# Altium schematic symbol library 13-Logic 数字 IC.SchLib: 324 symbols (part 10 of 30) (continued)
## MAX3485 (continued)
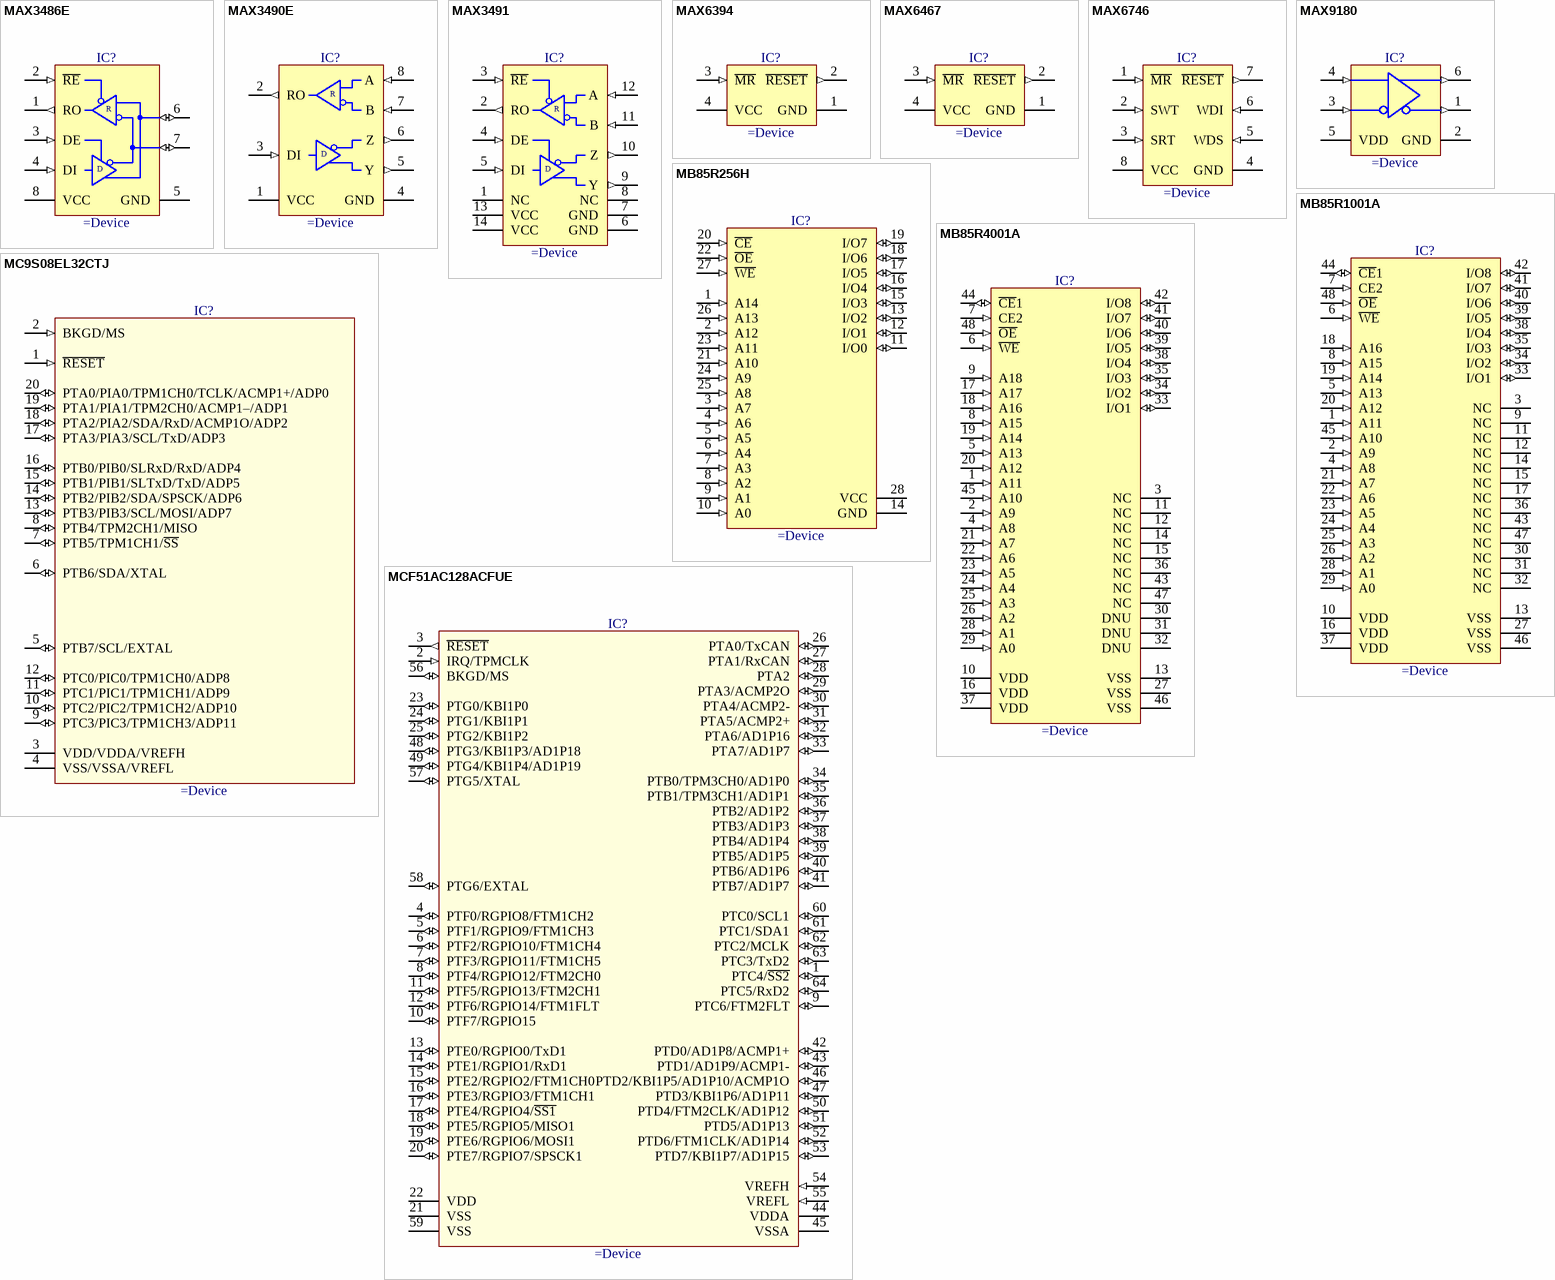
[diagram p62: symbols MAX3486E to MCF51AC128ACFUE]
text: R; D

## MAX3486E
designator IC?
3.3V-Powered, ±15kV ESD-Protected, 2.5Mbps and Slew-Rate-Limited True RS-485/RS-422 Transceiver
pins: 1 RO (out), 2 ~{RE} (in), 3 DE (in), 4 DI (in), 5 GND (power), 6 A (io), 7 B (io), 8 VCC (power)
text: R; D

## MAX3490E
designator IC?
3.3V-Powered, ±15kV ESD-Protected, 12Mbps RS-485/RS-422 Transceivers
pins: 1 VCC (power), 2 RO (out), 3 DI (in), 4 GND (power), 5 Y (out), 6 Z (out), 7 B (in), 8 A (in)
text: R; D

## MAX3491
designator IC?
3.3V-Powered, 10Mbps and Slew-Rate-Limited True RS-485/RS-422 Transceiver
pins: 1 NC, 2 RO (out), 3 ~{RE} (in), 4 DE (in), 5 DI (in), 6 GND (power), 7 GND (power), 8 NC, 9 Y (out), 10 Z (out), 11 B (in), 12 A (in), 13 VCC (power), 14 VCC (power)
text: R; D

## MAX6394
designator IC?
High-Accuracy  Microprocessor Reset Circuit
pins: 1 GND (power), 2 ~{RESET} (out), 3 ~{MR} (in), 4 VCC (power)

## MAX6467
designator IC?
Microprocessor Supervisory Reset Circuits with Edge-Triggered, One-Shot Manual Reset
pins: 1 GND (power), 2 ~{RESET} (out), 3 ~{MR} (in), 4 VCC (power)

## MAX6746
designator IC?
uP Reset Circuits with Capacitor-Adjustable Reset/Watchdog Timeout Delay
pins: 1 ~{MR} (in), 2 SWT (in), 3 SRT (in), 4 GND (power), 5 WDS (in), 6 WDI (in), 7 ~{RESET} (out), 8 VCC (power)

## MAX9180
designator IC?
400Mbps, Low-Jitter, Low-Noise LVDS Repeater
pins: 1 OUT- (out), 2 GND (power), 3 IN- (in), 4 IN+ (in), 5 VDD (power), 6 OUT+ (out)

## MB85R256H
designator IC?
3.3V 256 K (32 K × 8) Bit CMOS Memory FRAM
pins: 1 A14 (in), 2 A12 (in), 3 A7 (in), 4 A6 (in), 5 A5 (in), 6 A4 (in), 7 A3 (in), 8 A2 (in), 9 A1 (in), 10 A0 (in), 11 I/O0 (io), 12 I/O1 (io), 13 I/O2 (io), 14 GND (power), 15 I/O3 (io), 16 I/O4 (io), 17 I/O5 (io), 18 I/O6 (io), 19 I/O7 (io), 20 ~{CE} (in), 21 A10 (in), 22 ~{OE} (in), 23 A11 (in), 24 A9 (in), 25 A8 (in), 26 A13 (in), 27 ~{WE} (in), 28 VCC (power)

## MB85R1001A
designator IC?
1M Bit (128K × 8) Bit Memory FRAM
pins: 1 A11 (in), 2 A9 (in), 3 NC, 4 A8 (in), 5 A13 (in), 6 ~{WE} (in), 7 CE2 (in), 8 A15 (in), 9 NC, 10 VDD (power), 11 NC, 12 NC, 13 VSS (power), 14 NC, 15 NC, 16 VDD (power), 17 NC, 18 A16 (in), 19 A14 (in), 20 A12 (in), 21 A7 (in), 22 A6 (in), 23 A5 (in), 24 A4 (in), 25 A3 (in), 26 A2 (in), 27 VSS (power), 28 A1 (in), 29 A0 (in), 30 NC, 31 NC, 32 NC, 33 I/O1 (io), 34 I/O2 (io), 35 I/O3 (io), 36 NC, 37 VDD (power), 38 I/O4 (io), 39 I/O5 (io), 40 I/O6 (io), 41 I/O7 (io), 42 I/O8 (io), 43 NC, 44 ~{CE}1 (io), 45 A10 (in), 46 VSS (power), 47 NC, 48 ~{OE} (in)

## MB85R4001A
designator IC?
4M Bit (512 K × 8) Bit Memory FRAM
pins: 1 A11 (in), 2 A9 (in), 3 NC, 4 A8 (in), 5 A13 (in), 6 ~{WE} (in), 7 CE2 (in), 8 A15 (in), 9 A18 (in), 10 VDD (power), 11 NC, 12 NC, 13 VSS (power), 14 NC, 15 NC, 16 VDD (power), 17 A17 (in), 18 A16 (in), 19 A14 (in), 20 A12 (in), 21 A7 (in), 22 A6 (in), 23 A5 (in), 24 A4 (in), 25 A3 (in), 26 A2 (in), 27 VSS (power), 28 A1 (in), 29 A0 (in), 30 DNU, 31 DNU, 32 DNU, 33 I/O1 (io), 34 I/O2 (io), 35 I/O3 (io), 36 NC, 37 VDD (power), 38 I/O4 (io), 39 I/O5 (io), 40 I/O6 (io), 41 I/O7 (io), 42 I/O8 (io), 43 NC, 44 ~{CE}1 (io), 45 A10 (in), 46 VSS (power), 47 NC, 48 ~{OE} (in)

## MC9S08EL32CTJ
designator IC?
HCS08 Family, 8-Bit Microcontroller Units (MCU)
pins: 1 ~{RESET} (in), 2 BKGD/MS (in), 3 VDD/VDDA/VREFH (power), 4 VSS/VSSA/VREFL (power), 5 PTB7/SCL/EXTAL (io), 6 PTB6/SDA/XTAL (io), 7 PTB5/TPM1CH1/~{SS} (io), 8 PTB4/TPM2CH1/MISO (io), 9 PTC3/PIC3/TPM1CH3/ADP11 (io), 10 PTC2/PIC2/TPM1CH2/ADP10 (io), 11 PTC1/PIC1/TPM1CH1/ADP9 (io), 12 PTC0/PIC0/TPM1CH0/ADP8 (io), 13 PTB3/PIB3/SCL/MOSI/ADP7 (io), 14 PTB2/PIB2/SDA/SPSCK/ADP6 (io), 15 PTB1/PIB1/SLTxD/TxD/ADP5 (io), 16 PTB0/PIB0/SLRxD/RxD/ADP4 (io), 17 PTA3/PIA3/SCL/TxD/ADP3 (io), 18 PTA2/PIA2/SDA/RxD/ACMP1O/ADP2 (io), 19 PTA1/PIA1/TPM2CH0/ACMP1–/ADP1 (io), 20 PTA0/PIA0/TPM1CH0/TCLK/ACMP1+/ADP0 (io)

## MCF51AC128ACFUE
designator IC?
128Kb Flash/32Kb SRAM, 32-Bit ColdFire Microcontroller With CAN
pins: 1 PTC4/~{SS2} (io), 2 IRQ/TPMCLK (in), 3 ~{RESET} (out), 4 PTF0/RGPIO8/FTM1CH2 (io), 5 PTF1/RGPIO9/FTM1CH3 (io), 6 PTF2/RGPIO10/FTM1CH4 (io), 7 PTF3/RGPIO11/FTM1CH5 (io), 8 PTF4/RGPIO12/FTM2CH0 (io), 9 PTC6/FTM2FLT (io), 10 PTF7/RGPIO15 (io), 11 PTF5/RGPIO13/FTM2CH1 (io), 12 PTF6/RGPIO14/FTM1FLT (io), 13 PTE0/RGPIO0/TxD1 (io), 14 PTE1/RGPIO1/RxD1 (io), 15 PTE2/RGPIO2/FTM1CH0 (io), 16 PTE3/RGPIO3/FTM1CH1 (io), 17 PTE4/RGPIO4/~{SS1} (io), 18 PTE5/RGPIO5/MISO1 (io), 19 PTE6/RGPIO6/MOSI1 (io), 20 PTE7/RGPIO7/SPSCK1 (io), 21 VSS (power), 22 VDD (power), 23 PTG0/KBI1P0 (io), 24 PTG1/KBI1P1 (io), 25 PTG2/KBI1P2 (io), 26 PTA0/TxCAN (io), 27 PTA1/RxCAN (io), 28 PTA2 (io), 29 PTA3/ACMP2O (io), 30 PTA4/ACMP2- (io), 31 PTA5/ACMP2+ (io), 32 PTA6/AD1P16 (io), 33 PTA7/AD1P7 (io), 34 PTB0/TPM3CH0/AD1P0 (io), 35 PTB1/TPM3CH1/AD1P1 (io), 36 PTB2/AD1P2 (io), 37 PTB3/AD1P3 (io), 38 PTB4/AD1P4 (io), 39 PTB5/AD1P5 (io), 40 PTB6/AD1P6 (io), 41 PTB7/AD1P7 (io), 42 PTD0/AD1P8/ACMP1+ (io), 43 PTD1/AD1P9/ACMP1- (io), 44 VDDA (power), 45 VSSA (power), 46 PTD2/KBI1P5/AD1P10/ACMP1O (io), 47 PTD3/KBI1P6/AD1P11 (io), 48 PTG3/KBI1P3/AD1P18 (io), 49 PTG4/KBI1P4/AD1P19 (io), 50 PTD4/FTM2CLK/AD1P12 (io), 51 PTD5/AD1P13 (io), 52 PTD6/FTM1CLK/AD1P14 (io), 53 PTD7/KBI1P7/AD1P15 (io), 54 VREFH (in), 55 VREFL (in), 56 BKGD/MS (io), 57 PTG5/XTAL (io), 58 PTG6/EXTAL (io), 59 VSS (power), 60 PTC0/SCL1 (io), 61 PTC1/SDA1 (io), 62 PTC2/MCLK (io), 63 PTC3/TxD2 (io), 64 PTC5/RxD2 (io)

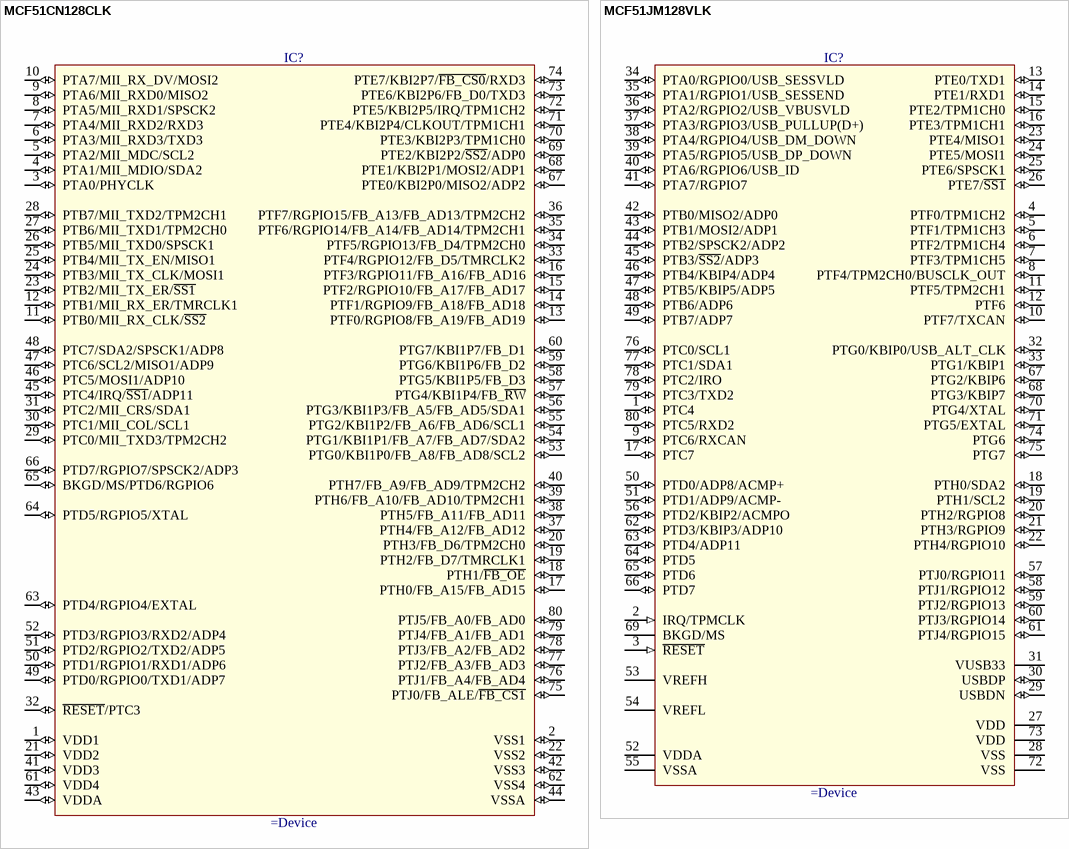
[diagram p63: symbols MCF51CN128CLK to MCF51JM128VLK]

## MCF51CN128CLK
designator IC?
128Kb Flash/24Kb RAM, 32-Bit ColdFire Microcontroller
pins: 1 VDD1 (io), 2 VSS1 (io), 3 PTA0/PHYCLK (io), 4 PTA1/MII_MDIO/SDA2 (io), 5 PTA2/MII_MDC/SCL2 (io), 6 PTA3/MII_RXD3/TXD3 (io), 7 PTA4/MII_RXD2/RXD3 (io), 8 PTA5/MII_RXD1/SPSCK2 (io), 9 PTA6/MII_RXD0/MISO2 (io), 10 PTA7/MII_RX_DV/MOSI2 (io), 11 PTB0/MII_RX_CLK/~{SS2} (io), 12 PTB1/MII_RX_ER/TMRCLK1 (io), 13 PTF0/RGPIO8/FB_A19/FB_AD19 (io), 14 PTF1/RGPIO9/FB_A18/FB_AD18 (io), 15 PTF2/RGPIO10/FB_A17/FB_AD17 (io), 16 PTF3/RGPIO11/FB_A16/FB_AD16 (io), 17 PTH0/FB_A15/FB_AD15 (io), 18 PTH1/~{FB_OE} (io), 19 PTH2/FB_D7/TMRCLK1 (io), 20 PTH3/FB_D6/TPM2CH0 (io), 21 VDD2 (io), 22 VSS2 (io), 23 PTB2/MII_TX_ER/~{SS1} (io), 24 PTB3/MII_TX_CLK/MOSI1 (io), 25 PTB4/MII_TX_EN/MISO1 (io), 26 PTB5/MII_TXD0/SPSCK1 (io), 27 PTB6/MII_TXD1/TPM2CH0 (io), 28 PTB7/MII_TXD2/TPM2CH1 (io), 29 PTC0/MII_TXD3/TPM2CH2 (io), 30 PTC1/MII_COL/SCL1 (io), 31 PTC2/MII_CRS/SDA1 (io), 32 ~{RESET}/PTC3 (io), 33 PTF4/RGPIO12/FB_D5/TMRCLK2 (io), 34 PTF5/RGPIO13/FB_D4/TPM2CH0 (io), 35 PTF6/RGPIO14/FB_A14/FB_AD14/TPM2CH1 (io), 36 PTF7/RGPIO15/FB_A13/FB_AD13/TPM2CH2 (io), 37 PTH4/FB_A12/FB_AD12 (io), 38 PTH5/FB_A11/FB_AD11 (io), 39 PTH6/FB_A10/FB_AD10/TPM2CH1 (io), 40 PTH7/FB_A9/FB_AD9/TPM2CH2 (io), 41 VDD3 (io), 42 VSS3 (io), 43 VDDA (io), 44 VSSA (io), 45 PTC4/IRQ/~{SS1}/ADP11 (io), 46 PTC5/MOSI1/ADP10 (io), 47 PTC6/SCL2/MISO1/ADP9 (io), 48 PTC7/SDA2/SPSCK1/ADP8 (io), 49 PTD0/RGPIO0/TXD1/ADP7 (io), 50 PTD1/RGPIO1/RXD1/ADP6 (io), 51 PTD2/RGPIO2/TXD2/ADP5 (io), 52 PTD3/RGPIO3/RXD2/ADP4 (io), 53 PTG0/KBI1P0/FB_A8/FB_AD8/SCL2 (io), 54 PTG1/KBI1P1/FB_A7/FB_AD7/SDA2 (io), 55 PTG2/KBI1P2/FB_A6/FB_AD6/SCL1 (io), 56 PTG3/KBI1P3/FB_A5/FB_AD5/SDA1 (io), 57 PTG4/KBI1P4/FB_~{RW} (io), 58 PTG5/KBI1P5/FB_D3 (io), 59 PTG6/KBI1P6/FB_D2 (io), 60 PTG7/KBI1P7/FB_D1 (io), 61 VDD4 (io), 62 VSS4 (io), 63 PTD4/RGPIO4/EXTAL (io), 64 PTD5/RGPIO5/XTAL (io), 65 BKGD/MS/PTD6/RGPIO6 (io), 66 PTD7/RGPIO7/SPSCK2/ADP3 (io), 67 PTE0/KBI2P0/MISO2/ADP2 (io), 68 PTE1/KBI2P1/MOSI2/ADP1 (io), 69 PTE2/KBI2P2/~{SS2}/ADP0 (io), 70 PTE3/KBI2P3/TPM1CH0 (io), 71 PTE4/KBI2P4/CLKOUT/TPM1CH1 (io), 72 PTE5/KBI2P5/IRQ/TPM1CH2 (io), 73 PTE6/KBI2P6/FB_D0/TXD3 (io), 74 PTE7/KBI2P7/~{FB_CS0}/RXD3 (io), 75 PTJ0/FB_ALE/~{FB_CS1} (io), 76 PTJ1/FB_A4/FB_AD4 (io), 77 PTJ2/FB_A3/FB_AD3 (io), 78 PTJ3/FB_A2/FB_AD2 (io), 79 PTJ4/FB_A1/FB_AD1 (io), 80 PTJ5/FB_A0/FB_AD0 (io)

## MCF51JM128VLK
designator IC?
128Kb Flash/16Kb SRAM, 32-Bit ColdFire Microcontroller
pins: 1 PTC4 (io), 2 IRQ/TPMCLK (in), 3 ~{RESET} (in), 4 PTF0/TPM1CH2 (io), 5 PTF1/TPM1CH3 (io), 6 PTF2/TPM1CH4 (io), 7 PTF3/TPM1CH5 (io), 8 PTF4/TPM2CH0/BUSCLK_OUT (io), 9 PTC6/RXCAN (io), 10 PTF7/TXCAN (io), 11 PTF5/TPM2CH1 (io), 12 PTF6 (io), 13 PTE0/TXD1 (io), 14 PTE1/RXD1 (io), 15 PTE2/TPM1CH0 (io), 16 PTE3/TPM1CH1 (io), 17 PTC7 (io), 18 PTH0/SDA2 (io), 19 PTH1/SCL2 (io), 20 PTH2/RGPIO8 (io), 21 PTH3/RGPIO9 (io), 22 PTH4/RGPIO10 (io), 23 PTE4/MISO1 (io), 24 PTE5/MOSI1 (io), 25 PTE6/SPSCK1 (io), 26 PTE7/~{SS1} (io), 27 VDD (power), 28 VSS (power), 29 USBDN (io), 30 USBDP (io), 31 VUSB33 (power), 32 PTG0/KBIP0/USB_ALT_CLK (io), 33 PTG1/KBIP1 (io), 34 PTA0/RGPIO0/USB_SESSVLD (io), 35 PTA1/RGPIO1/USB_SESSEND (io), 36 PTA2/RGPIO2/USB_VBUSVLD (io), 37 PTA3/RGPIO3/USB_PULLUP(D+) (io), 38 PTA4/RGPIO4/USB_DM_DOWN (io), 39 PTA5/RGPIO5/USB_DP_DOWN (io), 40 PTA6/RGPIO6/USB_ID (io), 41 PTA7/RGPIO7 (io), 42 PTB0/MISO2/ADP0 (io), 43 PTB1/MOSI2/ADP1 (io), 44 PTB2/SPSCK2/ADP2 (io), 45 PTB3/~{SS2}/ADP3 (io), 46 PTB4/KBIP4/ADP4 (io), 47 PTB5/KBIP5/ADP5 (io), 48 PTB6/ADP6 (io), 49 PTB7/ADP7 (io), 50 PTD0/ADP8/ACMP+ (io), 51 PTD1/ADP9/ACMP- (io), 52 VDDA (power), 53 VREFH (power), 54 VREFL (power), 55 VSSA (power), 56 PTD2/KBIP2/ACMPO (io), 57 PTJ0/RGPIO11 (io), 58 PTJ1/RGPIO12 (io), 59 PTJ2/RGPIO13 (io), 60 PTJ3/RGPIO14 (io), 61 PTJ4/RGPIO15 (io), 62 PTD3/KBIP3/ADP10 (io), 63 PTD4/ADP11 (io), 64 PTD5 (io), 65 PTD6 (io), 66 PTD7 (io), 67 PTG2/KBIP6 (io), 68 PTG3/KBIP7 (io), 69 BKGD/MS, 70 PTG4/XTAL (io), 71 PTG5/EXTAL (io), 72 VSS (power), 73 VDD (power), 74 PTG6 (io), 75 PTG7 (io), 76 PTC0/SCL1 (io), 77 PTC1/SDA1 (io), 78 PTC2/IRO (io), 79 PTC3/TXD2 (io), 80 PTC5/RXD2 (io)

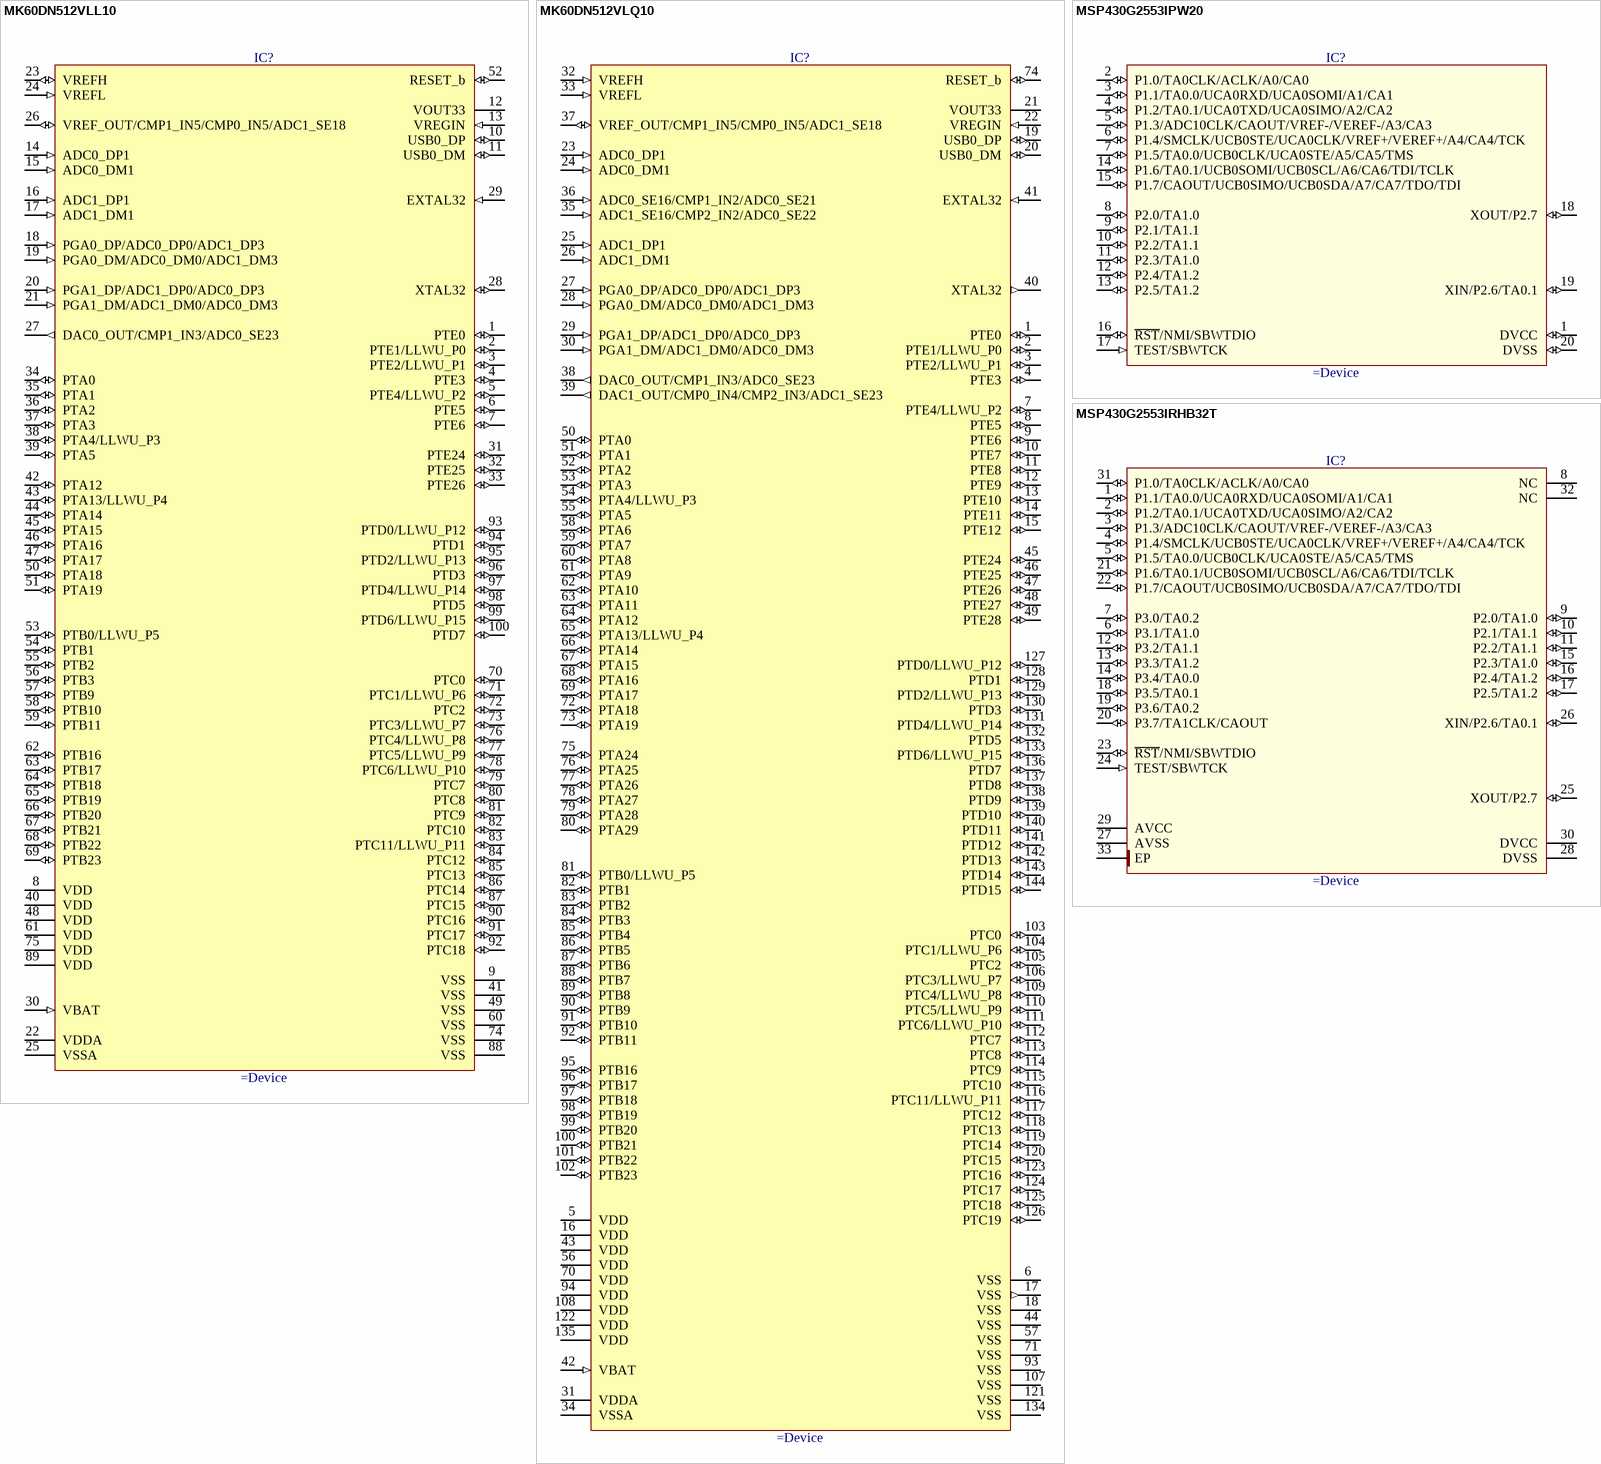
[diagram p64: symbols MK60DN512VLL10 to MSP430G2553IRHB32T]

## MK60DN512VLL10
designator IC?
32-Bit, 512Kb Flash, 128kb SRAM, 100MHz RISC Microcontroller (K60 Sub-Family)
pins: 1 PTE0 (io), 2 PTE1/LLWU_P0 (io), 3 PTE2/LLWU_P1 (io), 4 PTE3 (io), 5 PTE4/LLWU_P2 (io), 6 PTE5 (io), 7 PTE6 (io), 8 VDD (power), 9 VSS (power), 10 USB0_DP (io), 11 USB0_DM (io), 12 VOUT33 (power), 13 VREGIN (in), 14 ADC0_DP1 (in), 15 ADC0_DM1 (in), 16 ADC1_DP1 (in), 17 ADC1_DM1 (in), 18 PGA0_DP/ADC0_DP0/ADC1_DP3 (in), 19 PGA0_DM/ADC0_DM0/ADC1_DM3 (in), 20 PGA1_DP/ADC1_DP0/ADC0_DP3 (in), 21 PGA1_DM/ADC1_DM0/ADC0_DM3 (in), 22 VDDA (power), 23 VREFH (io), 24 VREFL (in), 25 VSSA (power), 26 VREF_OUT/CMP1_IN5/CMP0_IN5/ADC1_SE18 (io), 27 DAC0_OUT/CMP1_IN3/ADC0_SE23 (out), 28 XTAL32 (io), 29 EXTAL32 (in), 30 VBAT (in), 31 PTE24 (io), 32 PTE25 (io), 33 PTE26 (io), 34 PTA0 (io), 35 PTA1 (io), 36 PTA2 (io), 37 PTA3 (io), 38 PTA4/LLWU_P3 (io), 39 PTA5 (io), 40 VDD (power), 41 VSS (power), 42 PTA12 (io), 43 PTA13/LLWU_P4 (io), 44 PTA14 (io), 45 PTA15 (io), 46 PTA16 (io), 47 PTA17 (io), 48 VDD (power), 49 VSS (power), 50 PTA18 (io), 51 PTA19 (io), 52 RESET_b (io), 53 PTB0/LLWU_P5 (io), 54 PTB1 (io), 55 PTB2 (io), 56 PTB3 (io), 57 PTB9 (io), 58 PTB10 (io), 59 PTB11 (io), 60 VSS (power), 61 VDD (power), 62 PTB16 (io), 63 PTB17 (io), 64 PTB18 (io), 65 PTB19 (io), 66 PTB20 (io), 67 PTB21 (io), 68 PTB22 (io), 69 PTB23 (io), 70 PTC0 (io), 71 PTC1/LLWU_P6 (io), 72 PTC2 (io), 73 PTC3/LLWU_P7 (io), 74 VSS (power), 75 VDD (power), 76 PTC4/LLWU_P8 (io), 77 PTC5/LLWU_P9 (io), 78 PTC6/LLWU_P10 (io), 79 PTC7 (io), 80 PTC8 (io), 81 PTC9 (io), 82 PTC10 (io), 83 PTC11/LLWU_P11 (io), 84 PTC12 (io), 85 PTC13 (io), 86 PTC14 (io), 87 PTC15 (io), 88 VSS (power), 89 VDD (power), 90 PTC16 (io), 91 PTC17 (io), 92 PTC18 (io), 93 PTD0/LLWU_P12 (io), 94 PTD1 (io), 95 PTD2/LLWU_P13 (io), 96 PTD3 (io), 97 PTD4/LLWU_P14 (io), 98 PTD5 (io), 99 PTD6/LLWU_P15 (io), 100 PTD7 (io)

## MK60DN512VLQ10
designator IC?
32-Bit, 512Kb Flash, 128kb SRAM, 100MHz RISC Microcontroller (K60 Sub-Family)
pins: 1 PTE0 (io), 2 PTE1/LLWU_P0 (io), 3 PTE2/LLWU_P1 (io), 4 PTE3 (io), 5 VDD (power), 6 VSS (power), 7 PTE4/LLWU_P2 (io), 8 PTE5 (io), 9 PTE6 (io), 10 PTE7 (io), 11 PTE8 (io), 12 PTE9 (io), 13 PTE10 (io), 14 PTE11 (io), 15 PTE12 (io), 16 VDD (power), 17 VSS (out), 18 VSS (power), 19 USB0_DP (io), 20 USB0_DM (io), 21 VOUT33 (power), 22 VREGIN (in), 23 ADC0_DP1 (in), 24 ADC0_DM1 (in), 25 ADC1_DP1 (in), 26 ADC1_DM1 (in), 27 PGA0_DP/ADC0_DP0/ADC1_DP3 (in), 28 PGA0_DM/ADC0_DM0/ADC1_DM3 (in), 29 PGA1_DP/ADC1_DP0/ADC0_DP3 (in), 30 PGA1_DM/ADC1_DM0/ADC0_DM3 (in), 31 VDDA (power), 32 VREFH (in), 33 VREFL (in), 34 VSSA (power), 35 ADC1_SE16/CMP2_IN2/ADC0_SE22 (in), 36 ADC0_SE16/CMP1_IN2/ADC0_SE21 (in), 37 VREF_OUT/CMP1_IN5/CMP0_IN5/ADC1_SE18 (io), 38 DAC0_OUT/CMP1_IN3/ADC0_SE23 (out), 39 DAC1_OUT/CMP0_IN4/CMP2_IN3/ADC1_SE23 (out), 40 XTAL32 (out), 41 EXTAL32 (in), 42 VBAT (in), 43 VDD (power), 44 VSS (power), 45 PTE24 (io), 46 PTE25 (io), 47 PTE26 (io), 48 PTE27 (io), 49 PTE28 (io), 50 PTA0 (io), 51 PTA1 (io), 52 PTA2 (io), 53 PTA3 (io), 54 PTA4/LLWU_P3 (io), 55 PTA5 (io), 56 VDD (power), 57 VSS (power), 58 PTA6 (io), 59 PTA7 (io), 60 PTA8 (io), 61 PTA9 (io), 62 PTA10 (io), 63 PTA11 (io), 64 PTA12 (io), 65 PTA13/LLWU_P4 (io), 66 PTA14 (io), 67 PTA15 (io), 68 PTA16 (io), 69 PTA17 (io), 70 VDD (power), 71 VSS (power), 72 PTA18 (io), 73 PTA19 (io), 74 RESET_b (io), 75 PTA24 (io), 76 PTA25 (io), 77 PTA26 (io), 78 PTA27 (io), 79 PTA28 (io), 80 PTA29 (io), 81 PTB0/LLWU_P5 (io), 82 PTB1 (io), 83 PTB2 (io), 84 PTB3 (io), 85 PTB4 (io), 86 PTB5 (io), 87 PTB6 (io), 88 PTB7 (io), 89 PTB8 (io), 90 PTB9 (io), 91 PTB10 (io), 92 PTB11 (io), 93 VSS (power), 94 VDD (power), 95 PTB16 (io), 96 PTB17 (io), 97 PTB18 (io), 98 PTB19 (io), 99 PTB20 (io), 100 PTB21 (io), 101 PTB22 (io), 102 PTB23 (io), 103 PTC0 (io), 104 PTC1/LLWU_P6 (io), 105 PTC2 (io), 106 PTC3/LLWU_P7 (io), 107 VSS (power), 108 VDD (power), 109 PTC4/LLWU_P8 (io), 110 PTC5/LLWU_P9 (io), 111 PTC6/LLWU_P10 (io), 112 PTC7 (io), 113 PTC8 (io), 114 PTC9 (io), 115 PTC10 (io), 116 PTC11/LLWU_P11 (io), 117 PTC12 (io), 118 PTC13 (io), 119 PTC14 (io), 120 PTC15 (io), 121 VSS (power), 122 VDD (power), 123 PTC16 (io), 124 PTC17 (io), 125 PTC18 (io), 126 PTC19 (io), 127 PTD0/LLWU_P12 (io), 128 PTD1 (io), 129 PTD2/LLWU_P13 (io), 130 PTD3 (io), 131 PTD4/LLWU_P14 (io), 132 PTD5 (io), 133 PTD6/LLWU_P15 (io), 134 VSS (power), 135 VDD (power), 136 PTD7 (io), 137 PTD8 (io), 138 PTD9 (io), 139 PTD10 (io), 140 PTD11 (io), 141 PTD12 (io), 142 PTD13 (io), 143 PTD14 (io), 144 PTD15 (io)

## MSP430G2553IPW20
designator IC?
16Kb Flash/512Kb RAM, 16-Bit Mixed Signal Microcontroller
pins: 1 DVCC (io), 2 P1.0/TA0CLK/ACLK/A0/CA0 (io), 3 P1.1/TA0.0/UCA0RXD/UCA0SOMI/A1/CA1 (io), 4 P1.2/TA0.1/UCA0TXD/UCA0SIMO/A2/CA2 (io), 5 P1.3/ADC10CLK/CAOUT/VREF-/VEREF-/A3/CA3 (io), 6 P1.4/SMCLK/UCB0STE/UCA0CLK/VREF+/VEREF+/A4/CA4/TCK (io), 7 P1.5/TA0.0/UCB0CLK/UCA0STE/A5/CA5/TMS (io), 8 P2.0/TA1.0 (io), 9 P2.1/TA1.1 (io), 10 P2.2/TA1.1 (io), 11 P2.3/TA1.0 (io), 12 P2.4/TA1.2 (io), 13 P2.5/TA1.2 (io), 14 P1.6/TA0.1/UCB0SOMI/UCB0SCL/A6/CA6/TDI/TCLK (io), 15 P1.7/CAOUT/UCB0SIMO/UCB0SDA/A7/CA7/TDO/TDI (io), 16 ~{RST}/NMI/SBWTDIO (io), 17 TEST/SBWTCK (in), 18 XOUT/P2.7 (io), 19 XIN/P2.6/TA0.1 (io), 20 DVSS (io)

## MSP430G2553IRHB32T
designator IC?
16Kb Flash/512Kb RAM, 16-Bit Mixed Signal Microcontroller
pins: 1 P1.1/TA0.0/UCA0RXD/UCA0SOMI/A1/CA1 (io), 2 P1.2/TA0.1/UCA0TXD/UCA0SIMO/A2/CA2 (io), 3 P1.3/ADC10CLK/CAOUT/VREF-/VEREF-/A3/CA3 (io), 4 P1.4/SMCLK/UCB0STE/UCA0CLK/VREF+/VEREF+/A4/CA4/TCK (io), 5 P1.5/TA0.0/UCB0CLK/UCA0STE/A5/CA5/TMS (io), 6 P3.1/TA1.0 (io), 7 P3.0/TA0.2 (io), 8 NC, 9 P2.0/TA1.0 (io), 10 P2.1/TA1.1 (io), 11 P2.2/TA1.1 (io), 12 P3.2/TA1.1 (io), 13 P3.3/TA1.2 (io), 14 P3.4/TA0.0 (io), 15 P2.3/TA1.0 (io), 16 P2.4/TA1.2 (io), 17 P2.5/TA1.2 (io), 18 P3.5/TA0.1 (io), 19 P3.6/TA0.2 (io), 20 P3.7/TA1CLK/CAOUT (io), 21 P1.6/TA0.1/UCB0SOMI/UCB0SCL/A6/CA6/TDI/TCLK (io), 22 P1.7/CAOUT/UCB0SIMO/UCB0SDA/A7/CA7/TDO/TDI (io), 23 ~{RST}/NMI/SBWTDIO (io), 24 TEST/SBWTCK (in), 25 XOUT/P2.7 (io), 26 XIN/P2.6/TA0.1 (io), 27 AVSS (power), 28 DVSS (power), 29 AVCC (power), 30 DVCC (power), 31 P1.0/TA0CLK/ACLK/A0/CA0 (io), 32 NC, 33 EP (power)

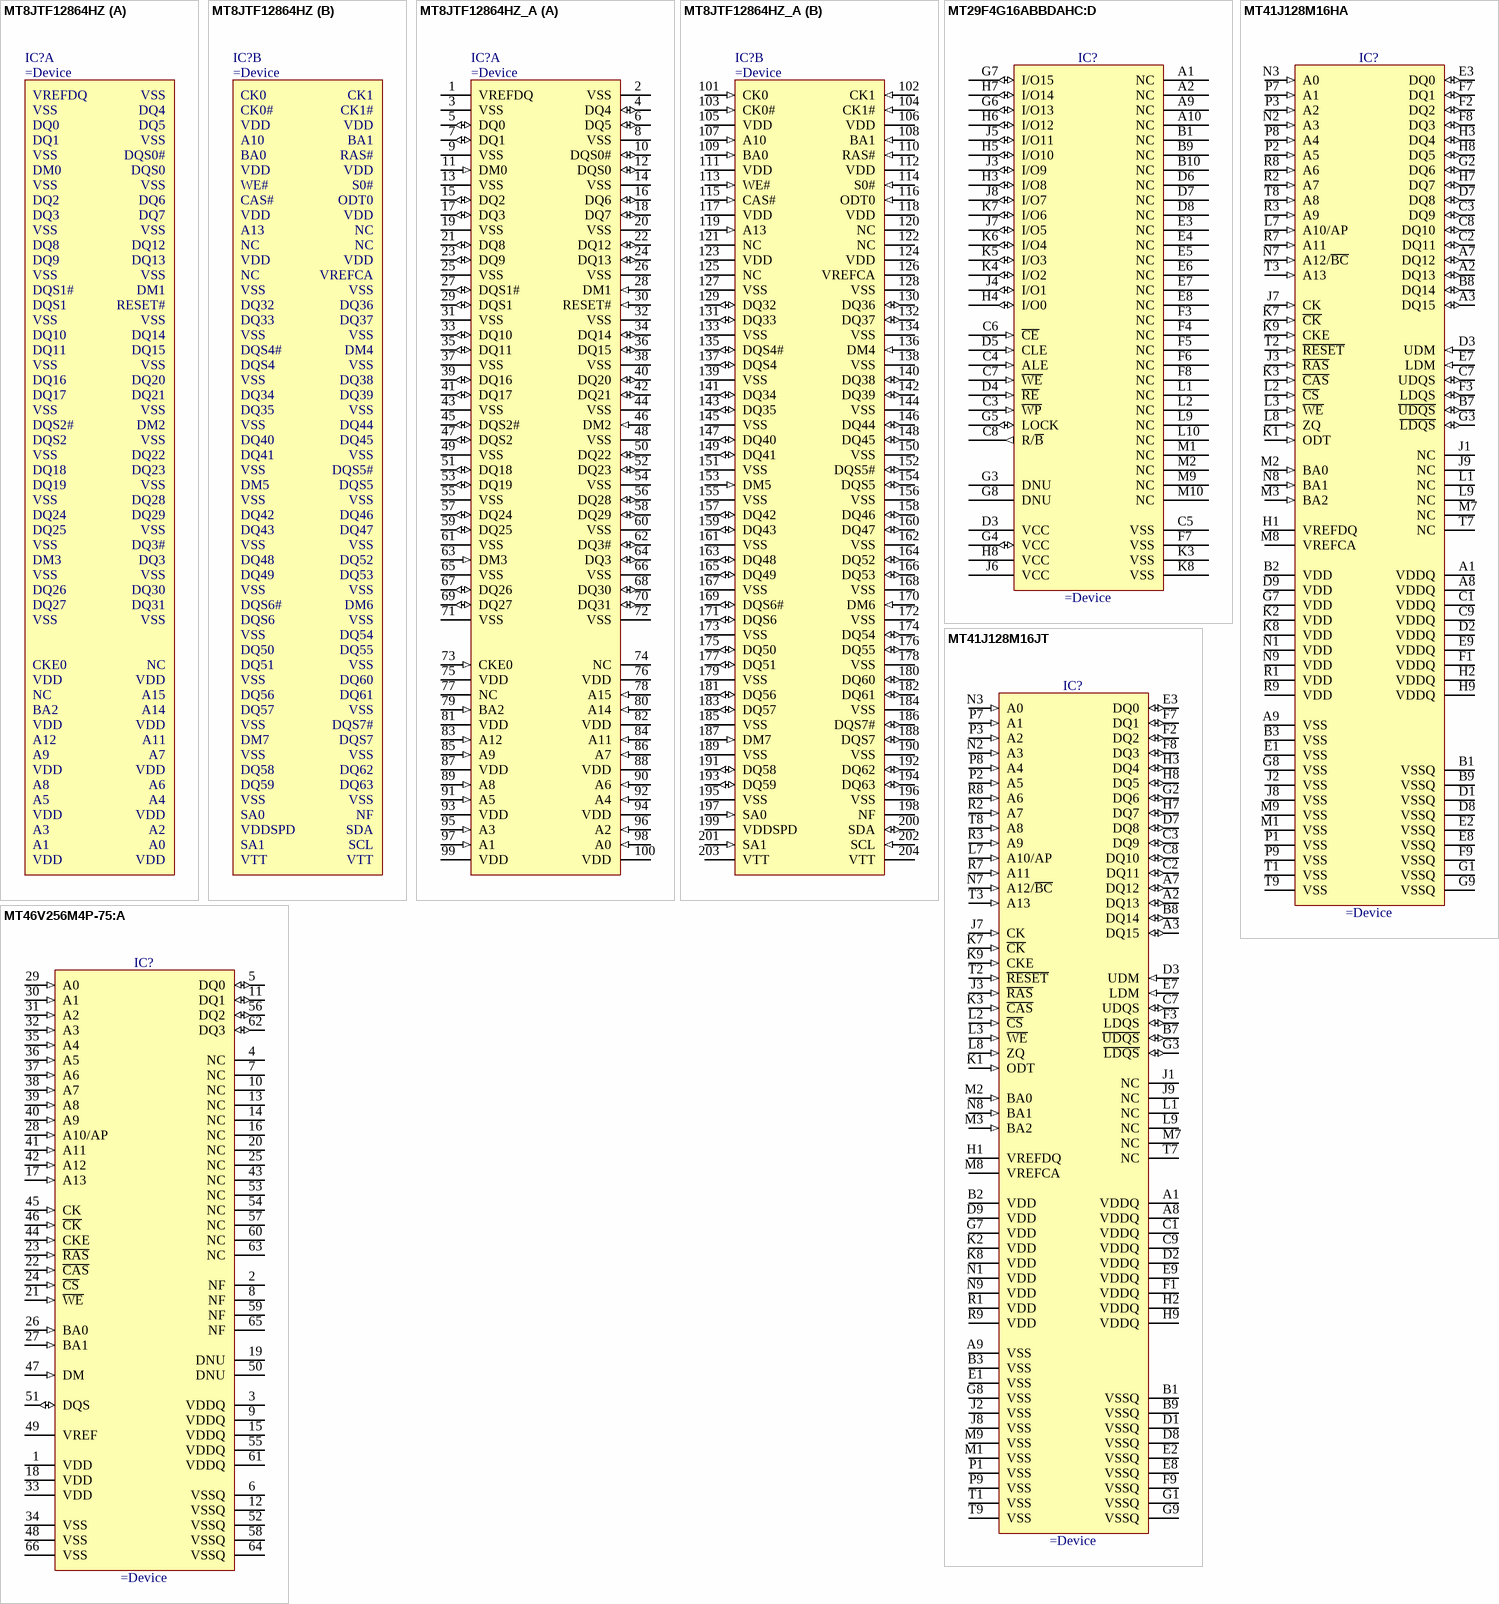
[diagram p65: symbols MT8JTF12864HZ to MT46V256M4P-75:A]

## MT8JTF12864HZ
designator IC?
1Gb (128Mx64) SODIMM 204-Pin DDR3 SDRAM Module
part A text: VREFDQ; VSS; DQ4; DQ0; DQ5; DQ1; DQS0#; DM0; DQS0; DQ2; DQ6; DQ3; DQ7; DQ8; DQ12; DQ9; DQ13; DQS1#; DM1; DQS1; RESET#; DQ10; DQ14; DQ11; DQ15; DQ16; DQ20; DQ17; DQ21; DQS2#; DM2; DQS2; DQ22; DQ18; DQ23; DQ19; DQ28; DQ24; DQ29; DQ25; DQ3#; DM3; DQ26; DQ30; DQ27; DQ31; CKE0; NC; VDD; A15; BA2; A14; A12; A11; A9; A7; A8; A6; A5; A4; A3; A2; A1; A0
part B text: CK0; CK1; CK0#; CK1#; VDD; A10; BA1; BA0; RAS#; WE#; S0#; CAS#; ODT0; A13; NC; VREFCA; VSS; DQ32; DQ36; DQ33; DQ37; DQS4#; DM4; DQS4; DQ38; DQ34; DQ39; DQ35; DQ44; DQ40; DQ45; DQ41; DQS5#; DM5; DQS5; DQ42; DQ46; DQ43; DQ47; DQ48; DQ52; DQ49; DQ53; DQS6#; DM6; DQS6; DQ54; DQ50; DQ55; DQ51; DQ60; DQ56; DQ61; DQ57; DQS7#; DM7; DQS7; DQ58; DQ62; DQ59; DQ63; SA0; NF; VDDSPD; SDA; SA1; SCL; VTT